# Altium footprint library texas.PCBLIB: 124 footprints (part 1 of 12) (continued)
## CUS [mm] (continued)
Top Overlay:
  lines w0.203: -7.898,7.35 -7.898,7.898 -7.35,7.898 ; -7.898,7.35 -7.898,-7.898 7.898,-7.898 7.898,7.898 -7.35,7.898 ; -7.898,7.35 -7.35,7.898
Top Solder:
  drawing of 423 lines, arcs and shapes, not listed

## D_R-PDSO-G08 [mm]
pads (8):
  rect 0.4x1.2 smd: 1(-1.905,-2.65) 2(-0.635,-2.65) 3(0.635,-2.65) 4(1.905,-2.65) 5(1.905,2.65) 6(0.635,2.65) 7(-0.635,2.65) 8(-1.905,2.65)
Top Overlay:
  circle w0.203: c-1.625,-1.3 r0.325
  lines w0.203: -2.35,-1.9 2.35,-1.9 2.35,1.9 -2.35,1.9 -2.35,-1.9
Mechanical 16:
  rectangle: -2.055,-3.05 -1.755,-1.98
  rectangle: -0.785,-3.05 -0.485,-1.98
  rectangle: 0.485,-3.05 0.785,-1.98
  rectangle: 1.755,-3.05 2.055,-1.98
  region: 2.055,3.05 1.755,3.05 1.755,1.98 2.055,1.98
  region: 0.785,3.05 0.485,3.05 0.485,1.98 0.785,1.98
  region: -0.485,3.05 -0.785,3.05 -0.785,1.98 -0.485,1.98
  region: -1.755,3.05 -2.055,3.05 -2.055,1.98 -1.755,1.98

## D_R-PDSO-G14 [mm]
pads (14):
  rect 0.4x1.2 smd: 1(-3.81,-2.65) 2(-2.54,-2.65) 3(-1.27,-2.65) 4(0,-2.65) 5(1.27,-2.65) 6(2.54,-2.65) 7(3.81,-2.65) 8(3.81,2.65) 9(2.54,2.65) 10(1.27,2.65) 11(0,2.65) 12(-1.27,2.65) 13(-2.54,2.65) 14(-3.81,2.65)
Top Overlay:
  circle w0.203: c-3.53,-1.3 r0.325
  lines w0.203: -4.255,-1.9 4.255,-1.9 4.255,1.9 -4.255,1.9 -4.255,-1.9
Mechanical 16:
  rectangle: -3.96,-3.05 -3.66,-1.98
  rectangle: -2.69,-3.05 -2.39,-1.98
  rectangle: -1.42,-3.05 -1.12,-1.98
  rectangle: -0.15,-3.05 0.15,-1.98
  rectangle: 1.12,-3.05 1.42,-1.98
  rectangle: 2.39,-3.05 2.69,-1.98
  rectangle: 3.66,-3.05 3.96,-1.98
  region: 3.96,3.05 3.66,3.05 3.66,1.98 3.96,1.98
  region: 2.69,3.05 2.39,3.05 2.39,1.98 2.69,1.98
  region: 1.42,3.05 1.12,3.05 1.12,1.98 1.42,1.98
  region: 0.15,3.05 -0.15,3.05 -0.15,1.98 0.15,1.98
  region: -1.12,3.05 -1.42,3.05 -1.42,1.98 -1.12,1.98
  region: -2.39,3.05 -2.69,3.05 -2.69,1.98 -2.39,1.98
  region: -3.66,3.05 -3.96,3.05 -3.96,1.98 -3.66,1.98

## D_R-PDSO-G16 [mm]
pads (16):
  rect 0.4x1.2 smd: 1(-4.445,-2.65) 2(-3.175,-2.65) 3(-1.905,-2.65) 4(-0.635,-2.65) 5(0.635,-2.65) 6(1.905,-2.65) 7(3.175,-2.65) 8(4.445,-2.65) 9(4.445,2.65) 10(3.175,2.65) 11(1.905,2.65) 12(0.635,2.65) 13(-0.635,2.65) 14(-1.905,2.65) 15(-3.175,2.65) 16(-4.445,2.65)
Top Overlay:
  circle w0.203: c-4.165,-1.3 r0.325
  lines w0.203: -4.89,-1.9 4.89,-1.9 4.89,1.9 -4.89,1.9 -4.89,-1.9
Mechanical 16:
  rectangle: -4.595,-3.05 -4.295,-1.98
  rectangle: -3.325,-3.05 -3.025,-1.98
  rectangle: -2.055,-3.05 -1.755,-1.98
  rectangle: -0.785,-3.05 -0.485,-1.98
  rectangle: 0.485,-3.05 0.785,-1.98
  rectangle: 1.755,-3.05 2.055,-1.98
  rectangle: 3.025,-3.05 3.325,-1.98
  rectangle: 4.295,-3.05 4.595,-1.98
  region: 4.595,3.05 4.295,3.05 4.295,1.98 4.595,1.98
  region: 3.325,3.05 3.025,3.05 3.025,1.98 3.325,1.98
  region: 2.055,3.05 1.755,3.05 1.755,1.98 2.055,1.98
  region: 0.785,3.05 0.485,3.05 0.485,1.98 0.785,1.98
  region: -0.485,3.05 -0.785,3.05 -0.785,1.98 -0.485,1.98
  region: -1.755,3.05 -2.055,3.05 -2.055,1.98 -1.755,1.98
  region: -3.025,3.05 -3.325,3.05 -3.325,1.98 -3.025,1.98
  region: -4.295,3.05 -4.595,3.05 -4.595,1.98 -4.295,1.98

## DB_R-PDSO-G28 [mil]
pads (28):
  rect 13.7x55 smd: 1(-166.34,-143.94) 2(-140.75,-143.94) 3(-115.16,-143.94) 4(-89.57,-143.94) 5(-63.98,-143.94) 6(-38.39,-143.94) 7(-12.8,-143.94) 8(12.8,-143.94) 9(38.39,-143.94) 10(63.98,-143.94) 11(89.57,-143.94) 12(115.16,-143.94) 13(140.75,-143.94) 14(166.34,-143.94) 15(166.34,143.94) 16(140.75,143.94) 17(115.16,143.94) 18(89.57,143.94) 19(63.98,143.94) 20(38.39,143.94) 21(12.8,143.94) 22(-12.8,143.94) 23(-38.39,143.94) 24(-63.98,143.94) 25(-89.57,143.94) 26(-115.16,143.94) 27(-140.75,143.94) 28(-166.34,143.94)
Top Overlay:
  circle w6: c-167.32,-69.88 r18.09
  lines w6: -203.74,-107.28 203.74,-107.28 203.74,107.28 -203.74,107.28 -203.74,-107.28
Mechanical 16:
  rectangle: -172.74,110.24 -159.94,161.42
  rectangle: -172.74,-161.42 -159.94,-110.24
  rectangle: -147.15,-161.42 -134.35,-110.24
  rectangle: -121.56,-161.42 -108.76,-110.24
  rectangle: -147.15,110.24 -134.35,161.42
  rectangle: -121.56,110.24 -108.76,161.42
  rectangle: -95.96,110.24 -83.17,161.42
  rectangle: -70.37,110.24 -57.58,161.42
  rectangle: -44.78,110.24 -31.99,161.42
  rectangle: -19.19,110.24 -6.4,161.42
  rectangle: 6.4,110.24 19.19,161.42
  rectangle: 31.99,110.24 44.78,161.42
  rectangle: 57.58,110.24 70.37,161.42
  rectangle: 83.17,110.24 95.96,161.42
  rectangle: 108.76,110.24 121.56,161.42
  rectangle: 134.35,110.24 147.15,161.42
  rectangle: 159.94,110.24 172.74,161.42
  rectangle: -95.96,-161.42 -83.17,-110.24
  rectangle: -70.37,-161.42 -57.58,-110.24
  rectangle: -44.78,-161.42 -31.99,-110.24
  rectangle: -19.19,-161.42 -6.4,-110.24
  rectangle: 6.4,-161.42 19.19,-110.24
  rectangle: 31.99,-161.42 44.78,-110.24
  rectangle: 57.58,-161.42 70.37,-110.24
  rectangle: 83.17,-161.42 95.96,-110.24
  rectangle: 108.76,-161.42 121.56,-110.24
  rectangle: 134.35,-161.42 147.15,-110.24
  rectangle: 159.94,-161.42 172.74,-110.24

## DBT_R-PDSO-G38 [mm]
pads (38):
  rect 0.3x1.2 smd: 1(-4.5,-2.9) 2(-4,-2.9) 3(-3.5,-2.9) 4(-3,-2.9) 5(-2.5,-2.9) 6(-2,-2.9) 7(-1.5,-2.9) 8(-1,-2.9) 9(-0.5,-2.9) 10(0,-2.9) 11(0.5,-2.9) 12(1,-2.9) 13(1.5,-2.9) 14(2,-2.9) 15(2.5,-2.9) 16(3,-2.9) 17(3.5,-2.9) 18(4,-2.9) 19(4.5,-2.9) 20(4.5,2.9) 21(4,2.9) 22(3.5,2.9) 23(3,2.9) 24(2.5,2.9) 25(2,2.9) 26(1.5,2.9) 27(1,2.9) 28(0.5,2.9) 29(0,2.9) 30(-0.5,2.9) 31(-1,2.9) 32(-1.5,2.9) 33(-2,2.9) 34(-2.5,2.9) 35(-3,2.9) 36(-3.5,2.9) 37(-4,2.9) 38(-4.5,2.9)
Top Overlay:
  circle w0: c-3.825,-1.3 r0.325
  lines w0.203: -4.8,-2.15 4.8,-2.15 4.8,2.15 -4.8,2.15 -4.8,-2.15
Top Solder:
  rectangle: -4.675,-3.55 -4.325,-2.25
  rectangle: -4.175,-3.55 -3.825,-2.25
  rectangle: -3.675,-3.55 -3.325,-2.25
  rectangle: -3.175,-3.55 -2.825,-2.25
  rectangle: -2.675,-3.55 -2.325,-2.25
  rectangle: -2.175,-3.55 -1.825,-2.25
  rectangle: -1.675,-3.55 -1.325,-2.25
  rectangle: -1.175,-3.55 -0.825,-2.25
  rectangle: -0.675,-3.55 -0.325,-2.25
  rectangle: -0.175,-3.55 0.175,-2.25
  rectangle: 0.325,-3.55 0.675,-2.25
  rectangle: 0.825,-3.55 1.175,-2.25
  rectangle: 1.325,-3.55 1.675,-2.25
  rectangle: 1.825,-3.55 2.175,-2.25
  rectangle: 2.325,-3.55 2.675,-2.25
  rectangle: 2.825,-3.55 3.175,-2.25
  rectangle: 3.325,-3.55 3.675,-2.25
  rectangle: 3.825,-3.55 4.175,-2.25
  rectangle: 4.325,-3.55 4.675,-2.25
  region: 4.675,3.55 4.325,3.55 4.325,2.25 4.675,2.25
  region: 4.175,3.55 3.825,3.55 3.825,2.25 4.175,2.25
  region: 3.675,3.55 3.325,3.55 3.325,2.25 3.675,2.25
  region: 3.175,3.55 2.825,3.55 2.825,2.25 3.175,2.25
  region: 2.675,3.55 2.325,3.55 2.325,2.25 2.675,2.25
  region: 2.175,3.55 1.825,3.55 1.825,2.25 2.175,2.25
  region: 1.675,3.55 1.325,3.55 1.325,2.25 1.675,2.25
  region: 1.175,3.55 0.825,3.55 0.825,2.25 1.175,2.25
  region: 0.675,3.55 0.325,3.55 0.325,2.25 0.675,2.25
  region: 0.175,3.55 -0.175,3.55 -0.175,2.25 0.175,2.25
  region: -0.325,3.55 -0.675,3.55 -0.675,2.25 -0.325,2.25
  region: -0.825,3.55 -1.175,3.55 -1.175,2.25 -0.825,2.25
  region: -1.325,3.55 -1.675,3.55 -1.675,2.25 -1.325,2.25
  region: -1.825,3.55 -2.175,3.55 -2.175,2.25 -1.825,2.25
  region: -2.325,3.55 -2.675,3.55 -2.675,2.25 -2.325,2.25
  region: -2.825,3.55 -3.175,3.55 -3.175,2.25 -2.825,2.25
  region: -3.325,3.55 -3.675,3.55 -3.675,2.25 -3.325,2.25
  region: -3.825,3.55 -4.175,3.55 -4.175,2.25 -3.825,2.25
  region: -4.325,3.55 -4.675,3.55 -4.675,2.25 -4.325,2.25
Mechanical 16:
  rectangle: -4.625,-3.3 -4.375,-2.23
  rectangle: -4.125,-3.3 -3.875,-2.23
  rectangle: -3.625,-3.3 -3.375,-2.23
  rectangle: -3.125,-3.3 -2.875,-2.23
  rectangle: -2.625,-3.3 -2.375,-2.23
  rectangle: -2.125,-3.3 -1.875,-2.23
  rectangle: -1.625,-3.3 -1.375,-2.23
  rectangle: -1.125,-3.3 -0.875,-2.23
  rectangle: -0.625,-3.3 -0.375,-2.23
  rectangle: -0.125,-3.3 0.125,-2.23
  rectangle: 0.375,-3.3 0.625,-2.23
  rectangle: 0.875,-3.3 1.125,-2.23
  rectangle: 1.375,-3.3 1.625,-2.23
  rectangle: 1.875,-3.3 2.125,-2.23
  rectangle: 2.375,-3.3 2.625,-2.23
  rectangle: 2.875,-3.3 3.125,-2.23
  rectangle: 3.375,-3.3 3.625,-2.23
  rectangle: 3.875,-3.3 4.125,-2.23
  rectangle: 4.375,-3.3 4.625,-2.23
  region: 4.625,3.3 4.375,3.3 4.375,2.23 4.625,2.23
  region: 4.125,3.3 3.875,3.3 3.875,2.23 4.125,2.23
  region: 3.625,3.3 3.375,3.3 3.375,2.23 3.625,2.23
  region: 3.125,3.3 2.875,3.3 2.875,2.23 3.125,2.23
  region: 2.625,3.3 2.375,3.3 2.375,2.23 2.625,2.23
  region: 2.125,3.3 1.875,3.3 1.875,2.23 2.125,2.23
  region: 1.625,3.3 1.375,3.3 1.375,2.23 1.625,2.23
  region: 1.125,3.3 0.875,3.3 0.875,2.23 1.125,2.23
  region: 0.625,3.3 0.375,3.3 0.375,2.23 0.625,2.23
  region: 0.125,3.3 -0.125,3.3 -0.125,2.23 0.125,2.23
  region: -0.375,3.3 -0.625,3.3 -0.625,2.23 -0.375,2.23
  region: -0.875,3.3 -1.125,3.3 -1.125,2.23 -0.875,2.23
  region: -1.375,3.3 -1.625,3.3 -1.625,2.23 -1.375,2.23
  region: -1.875,3.3 -2.125,3.3 -2.125,2.23 -1.875,2.23
  region: -2.375,3.3 -2.625,3.3 -2.625,2.23 -2.375,2.23
  region: -2.875,3.3 -3.125,3.3 -3.125,2.23 -2.875,2.23
  region: -3.375,3.3 -3.625,3.3 -3.625,2.23 -3.375,2.23
  region: -3.875,3.3 -4.125,3.3 -4.125,2.23 -3.875,2.23
  region: -4.375,3.3 -4.625,3.3 -4.625,2.23 -4.375,2.23

## DBZ_R-PDSO-G3 [mm]
pads (3):
  rect 0.7x1 smd: 1(-0.95,-1.1) 2(0.95,-1.1) 3(0,1.1)
Mechanical 6:
  rectangle: -0.5,-0.3 0.5,0.3
Mechanical 16:
  rectangle: -0.229,0.711 0.229,1.295
  rectangle: 0.711,-1.295 1.168,-0.711
  rectangle: -1.168,-1.295 -0.711,-0.711
  lines w0.152: -1.422,-0.66 1.422,-0.66 1.422,0.66 -1.422,0.66 -1.422,-0.66
Mechanical 27:
  lines w0.051: -1.973,-1.983 1.973,-1.983 1.973,1.983 -1.973,1.983 -1.973,-1.983

## DCK [mm]
pads (5):
  rect 0.35x0.8 smd: 1(-0.65,-0.925) 2(0,-0.925) 3(0.65,-0.925) 4(0.65,0.925) 5(-0.65,0.925)
Top Overlay:
  circle w0: c-0.65,-0.2 r0.15
  lines w0.203: -0.975,-0.6 -0.975,0.6 ; 0.975,-0.6 0.975,0.6
Top Solder:
  rectangle: -0.225,-1.375 0.225,-0.475
  rectangle: -0.875,-1.375 -0.425,-0.475
  rectangle: 0.425,-1.375 0.875,-0.475
  region: 0.875,1.375 0.425,1.375 0.425,0.475 0.875,0.475
  region: -0.425,1.375 -0.875,1.375 -0.875,0.475 -0.425,0.475
Mechanical 16:
  rectangle: 0.5,0.6 0.8,1.2
  rectangle: -0.8,0.6 -0.5,1.2
  rectangle: -0.8,-1.2 -0.5,-0.6
  rectangle: -0.15,-1.2 0.15,-0.6
  rectangle: 0.5,-1.2 0.8,-0.6
  lines w0.203: -0.975,-0.6 0.975,-0.6 ; -0.975,0.6 0.975,0.6

## DCK_R-PDSO-G5 [mm]
pads (5):
  rect 0.35x0.8 smd: 1(-0.65,-0.95) 2(0,-0.95) 3(0.65,-0.95) 4(0.65,0.95) 5(-0.65,0.95)
Top Overlay:
  rectangle: -1.016,-0.508 -0.127,0
  lines w0.203: -0.975,-0.6 -0.975,0.6 ; 0.975,-0.6 0.975,0.6
Mechanical 16:
  rectangle: 0.5,0.675 0.8,1.2
  rectangle: -0.8,0.675 -0.5,1.2
  rectangle: -0.8,-1.2 -0.5,-0.675
  rectangle: -0.15,-1.2 0.15,-0.675
  rectangle: 0.5,-1.2 0.8,-0.675
  lines w0.203: -0.975,-0.6 0.975,-0.6 ; -0.975,0.6 0.975,0.6

## DCN-R-PDSO-G8 [mm]
pads (8):
  rect 0.45x0.8 smd: 1(-0.975,-1.35) 2(-0.325,-1.35) 3(0.325,-1.35) 4(0.975,-1.35) 5(0.975,1.35) 6(0.325,1.35) 7(-0.325,1.35) 8(-0.975,1.35)
Top Overlay:
  rectangle: -1.4,-0.75 0,0
  lines w0.203: -1.4,-0.775 1.4,-0.775 1.4,0.775 -1.4,0.775 -1.4,-0.775
Top Paste:
  rectangle: -1.175,-1.725 -0.775,-0.975
  rectangle: -0.525,-1.725 -0.125,-0.975
  rectangle: 0.125,-1.725 0.525,-0.975
  rectangle: 0.775,-1.725 1.175,-0.975
  region: 1.175,1.725 0.775,1.725 0.775,0.975 1.175,0.975
  region: 0.525,1.725 0.125,1.725 0.125,0.975 0.525,0.975
  region: -0.125,1.725 -0.525,1.725 -0.525,0.975 -0.125,0.975
  region: -0.775,1.725 -1.175,1.725 -1.175,0.975 -0.775,0.975
Top Solder:
  rectangle: -1.225,-1.825 -0.725,-0.875
  rectangle: -0.575,-1.825 -0.075,-0.875
  rectangle: 0.075,-1.825 0.575,-0.875
  rectangle: 0.725,-1.825 1.225,-0.875
  region: 1.225,1.825 0.725,1.825 0.725,0.875 1.225,0.875
  region: 0.575,1.825 0.075,1.825 0.075,0.875 0.575,0.875
  region: -0.075,1.825 -0.575,1.825 -0.575,0.875 -0.075,0.875
  region: -0.725,1.825 -1.225,1.825 -1.225,0.875 -0.725,0.875
  region: 1.225,1.825 0.725,1.825 0.725,0.875 1.225,0.875
  region: 0.575,1.825 0.075,1.825 0.075,0.875 0.575,0.875
  region: -0.075,1.825 -0.575,1.825 -0.575,0.875 -0.075,0.875
  region: -0.725,1.825 -1.225,1.825 -1.225,0.875 -0.725,0.875
Mechanical 16:
  rectangle: -1.15,-1.5 -0.8,-0.825
  rectangle: -0.5,-1.5 -0.15,-0.825
  rectangle: 0.15,-1.5 0.5,-0.825
  rectangle: 0.8,-1.5 1.15,-0.825
  region: 1.15,1.5 0.8,1.5 0.8,0.825 1.15,0.825
  region: 0.5,1.5 0.15,1.5 0.15,0.825 0.5,0.825
  region: -0.15,1.5 -0.5,1.5 -0.5,0.825 -0.15,0.825
  region: -0.8,1.5 -1.15,1.5 -1.15,0.825 -0.8,0.825

## DCU_(R-PDSO-G8) [mil]
pads (8):
  rect 11.81x31.5 smd: 1(-29.53,-61.02) 2(-9.84,-61.02) 3(9.84,-61.02) 4(29.53,-61.02) 5(29.53,61.02) 6(9.84,61.02) 7(-9.84,61.02) 8(-29.53,61.02)
Top Overlay:
  rectangle: -37.4,-39.37 0,0
  lines w7.87: -37.4,-35.43 -37.4,34.94 ; 37.4,-35.43 37.4,34.94
Top Paste:
  rectangle: -34.45,-75.79 -24.61,-46.26
  rectangle: -14.76,-75.79 -4.92,-46.26
  rectangle: 4.92,-75.79 14.76,-46.26
  rectangle: 24.61,-75.79 34.45,-46.26
  region: 34.45,75.79 24.61,75.79 24.61,46.26 34.45,46.26
  region: 14.76,75.79 4.92,75.79 4.92,46.26 14.76,46.26
  region: -4.92,75.79 -14.76,75.79 -14.76,46.26 -4.92,46.26
  region: -24.61,75.79 -34.45,75.79 -34.45,46.26 -24.61,46.26
Top Solder:
  rectangle: -37.4,-78.74 -21.65,-43.31
  rectangle: -17.72,-78.74 -1.97,-43.31
  rectangle: 1.97,-78.74 17.72,-43.31
  rectangle: 21.65,-78.74 37.4,-43.31
  region: 37.4,78.74 21.65,78.74 21.65,43.31 37.4,43.31
  region: 17.72,78.74 1.97,78.74 1.97,43.31 17.72,43.31
  region: -1.97,78.74 -17.72,78.74 -17.72,43.31 -1.97,43.31
  region: -21.65,78.74 -37.4,78.74 -37.4,43.31 -21.65,43.31
Mechanical 16:
  rectangle: -41.34,-41.34 0,0
  rectangle: -34.45,45.77 -24.61,62.99
  rectangle: -14.76,45.77 -4.92,62.99
  rectangle: 4.92,45.77 14.76,62.99
  rectangle: 24.61,45.77 34.45,62.99
  region: 34.45,-45.77 24.61,-45.77 24.61,-62.99 34.45,-62.99
  region: 14.76,-45.77 4.92,-45.77 4.92,-62.99 14.76,-62.99
  region: -4.92,-45.77 -14.76,-45.77 -14.76,-62.99 -4.92,-62.99
  region: -24.61,-45.77 -34.45,-45.77 -34.45,-62.99 -24.61,-62.99
  lines w7.87: -37.4,-43.31 37.4,-43.31 37.4,42.82 -37.4,42.82 -37.4,-43.31

## DDC232 [mm]
pads (40):
  rrect50% 0.85x0.3 smd: 1(-3.325,2.25) 2(-3.325,1.75) 3(-3.325,1.25) 4(-3.325,0.75) 5(-3.325,0.25) 6(-3.325,-0.25) 7(-3.325,-0.75) 8(-3.325,-1.25) 9(-3.325,-1.75) 10(-3.325,-2.25) 21(3.325,-2.25) 22(3.325,-1.75) 23(3.325,-1.25) 24(3.325,-0.75) 25(3.325,-0.25) 26(3.325,0.25) 27(3.325,0.75) 28(3.325,1.25) 29(3.325,1.75) 30(3.325,2.25)
  rrect50% 0.3x0.85 smd: 11(-2.25,-3.325) 12(-1.75,-3.325) 13(-1.25,-3.325) 14(-0.75,-3.325) 15(-0.25,-3.325) 16(0.25,-3.325) 17(0.75,-3.325) 18(1.25,-3.325) 19(1.75,-3.325) 20(2.25,-3.325) 31(2.25,3.325) 32(1.75,3.325) 33(1.25,3.325) 34(0.75,3.325) 35(0.25,3.325) 36(-0.25,3.325) 37(-0.75,3.325) 38(-1.25,3.325) 39(-1.75,3.325) 40(-2.25,3.325)
Top Overlay:
  lines w0.203: -2.973,2.875 -2.875,2.973 ; -2.973,-2.973 2.973,-2.973 2.973,2.973 -2.973,2.973 -2.973,-2.973
Mechanical 16:
  rectangle: -3.4,2.135 -3.075,2.365
  rectangle: -3.4,1.635 -3.075,1.865
  rectangle: -3.4,1.135 -3.075,1.365
  rectangle: -3.4,0.635 -3.075,0.865
  rectangle: -3.4,0.135 -3.075,0.365
  rectangle: -3.4,-0.365 -3.075,-0.135
  rectangle: -3.4,-0.865 -3.075,-0.635
  rectangle: -3.4,-1.365 -3.075,-1.135
  rectangle: -3.4,-1.865 -3.075,-1.635
  rectangle: -3.4,-2.365 -3.075,-2.135
  rectangle: -2.365,-3.4 -2.135,-3.075
  rectangle: -1.865,-3.4 -1.635,-3.075
  rectangle: -1.365,-3.4 -1.135,-3.075
  rectangle: -0.865,-3.4 -0.635,-3.075
  rectangle: -0.365,-3.4 -0.135,-3.075
  rectangle: 0.135,-3.4 0.365,-3.075
  rectangle: 0.635,-3.4 0.865,-3.075
  rectangle: 1.135,-3.4 1.365,-3.075
  rectangle: 1.635,-3.4 1.865,-3.075
  rectangle: 2.135,-3.4 2.365,-3.075
  rectangle: 3.075,-2.365 3.4,-2.135
  rectangle: 3.075,-1.865 3.4,-1.635
  rectangle: 3.075,-1.365 3.4,-1.135
  rectangle: 3.075,-0.865 3.4,-0.635
  rectangle: 3.075,-0.365 3.4,-0.135
  rectangle: 3.075,0.135 3.4,0.365
  rectangle: 3.075,0.635 3.4,0.865
  rectangle: 3.075,1.135 3.4,1.365
  rectangle: 3.075,1.635 3.4,1.865
  rectangle: 3.075,2.135 3.4,2.365
  rectangle: 2.135,3.075 2.365,3.4
  rectangle: 1.635,3.075 1.865,3.4
  rectangle: 1.135,3.075 1.365,3.4
  rectangle: 0.635,3.075 0.865,3.4
  rectangle: 0.135,3.075 0.365,3.4
  rectangle: -0.365,3.075 -0.135,3.4
  rectangle: -0.865,3.075 -0.635,3.4
  rectangle: -1.365,3.075 -1.135,3.4
  rectangle: -1.865,3.075 -1.635,3.4
  rectangle: -2.365,3.075 -2.135,3.4

## DDPACK-7 [mil]
pads (7):
  rect 35x120 smd: 1(-150,-325) 2(-100,-325) 3(-50,-325) 4(0,-325) 5(50,-325) 6(100,-325) 7(150,-325)
Top Overlay:
  rectangle: -166,-254 -134,-198
  rectangle: -116,-254 -84,-198
  rectangle: -66,-254 -34,-198
  rectangle: -16,-254 16,-198
  rectangle: 34,-254 66,-198
  rectangle: 84,-254 116,-198
  rectangle: 134,-254 166,-198
  lines w10: -200,-195 -200,215 -150,230 145,230 200,215 200,-195 -200,-195
Mechanical 14:
  region: 0,0 10,0 10,10 0,10
Mechanical 16:
  rectangle: -166,-372 -134,-254
  rectangle: -116,-372 -84,-254
  rectangle: -66,-372 -34,-254
  rectangle: -16,-372 16,-254
  rectangle: 34,-372 66,-254
  rectangle: 84,-372 116,-254
  rectangle: 134,-372 166,-254